# Altium schematic symbol library Minh_Lib.SchLib: 619 symbols (part 3 of 4) (continued)
## HC-05-06-SMD (continued)

## HC-05-06-TH
designator M?
Manufacturer: *; Manufacturer Part Number: *; Local Supplier: thegioiic; Local Supplier Part Numer: *; Local Supplier Link: https://www.thegioiic.com/products/hc-05-thu-phat-bluetooth-ra-chan-master-slave
footprint HC-05-06-TH
pins: 1 STATE, 2 RXD, 3 TXD, 4 GND, 5 VCC, 6 KEY

## HDR1x2_2.54_MALE
designator P?, comment Header1x2_Male
Header1x2_2.54_MALE
footprint HDR1x2_2.54_MALE (Header2x1 2.54 MALE)
pins: 1, 2

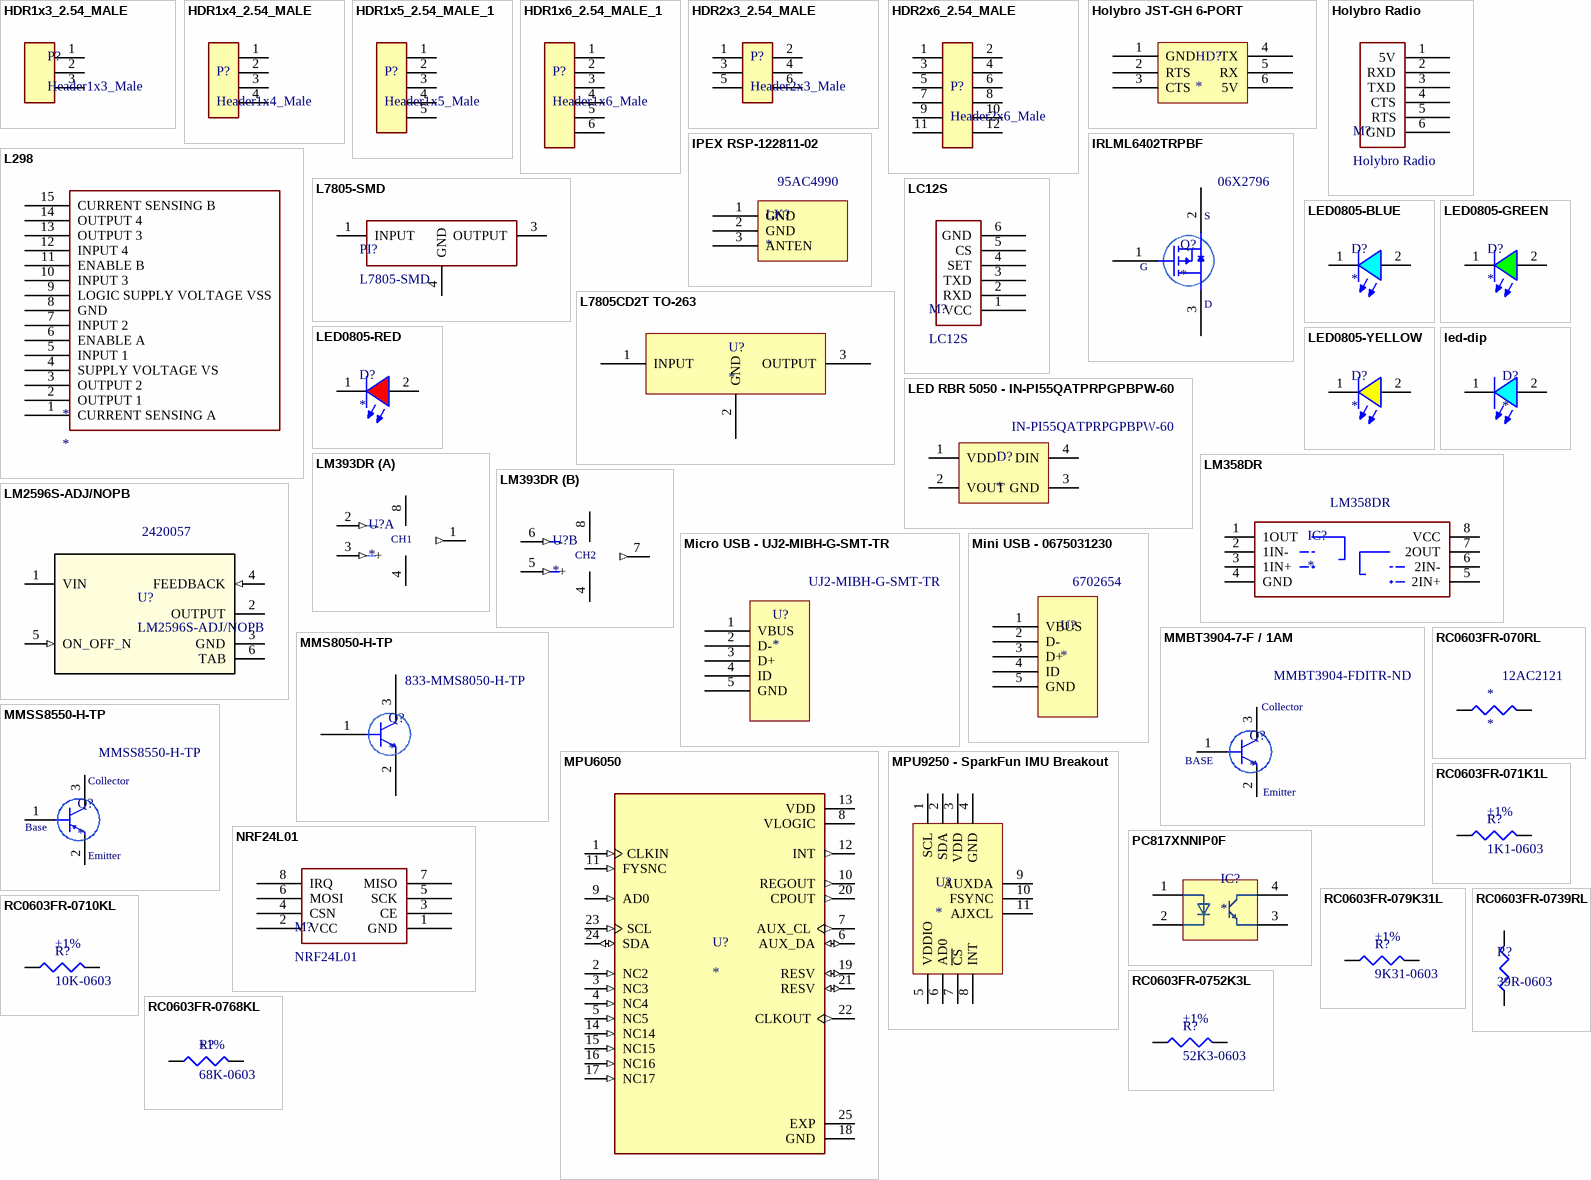
[diagram p10: symbols HDR1x3_2.54_MALE to RC0603FR-0768KL]

## HDR1x3_2.54_MALE
designator P?, comment Header1x3_Male
Header1x3_2.54_MALE
footprint HDR1x3_2.54_MALE (Header 2.54 MALE)
pins: 1, 2, 3

## HDR1x4_2.54_MALE
designator P?, comment Header1x4_Male
Header1x4_2.54_MALE
footprint HDR1X4_2.54_MALE (Header1x4 2.54 Male)
pins: 1, 2, 3, 4

## HDR1x5_2.54_MALE_1
designator P?, comment Header1x5_Male
Header1x5_2.54_MALE
footprint HDR1X5_2.54_MALE (Header1x5 2.54 Male)
pins: 1, 2, 3, 4, 5

## HDR1x6_2.54_MALE_1
designator P?, comment Header1x6_Male
Header1x6_2.54_MALE
footprint HDR1X6_2.54_MALE (Header1x6 2.54 Male)
pins: 1, 2, 3, 4, 5, 6

## HDR2x3_2.54_MALE
designator P?, comment Header2x3_Male
Header2x3_2.54_MALE
footprint HDR2x3_2.54_MALE (Header 2x3 2.54 MALE)
pins: 1, 2, 3, 4, 5, 6

## HDR2x6_2.54_MALE
designator P?, comment Header2x6_Male
Header2x6_2.54_MALE
footprint HDR2X6_2.54_MALE (Header2x6 2.54 Male)
pins: 1, 2, 3, 4, 5, 6, 7, 8, 9, 10, 11, 12

## Holybro JST-GH 6-PORT
designator HD?
footprint BM06B-GHS-TBT (JST - GH - 6 PORT)
pins: 1 GND, 2 RTS, 3 CTS, 4 TX, 5 RX, 6 5V

## Holybro Radio
designator M?
Supplier: *; Supplier Part Number: *; Manufacturer: *; Manufacturer Part Number: *; Supplier Link: https://www.lazada.vn/products/ld-holybro-433mhz-915-mhz-500-mw-thu-phat-vo-tuyen-xa-bo-v3-cho-pixhawk-4-dieu-khien-chuyen-bay-i430804435-s768474304.html?spm=a2o4n.searchlist.list.4.25396b19yIS9XO&search=1; Local Supplier: x; Local Supplier Part Number: x; Local Supplier Link: x
footprint HOLYBRO-RADIO (JP6)
pins: 1 5V, 2 RXD, 3 TXD, 4 CTS, 5 RTS, 6 GND

## IPEX RSP-122811-02
designator LK?  Supplier Part Number 1: 95AC4990
Conn MHF RCP 0Hz to 6GHz 50Ohm Solder ST SMD T/R; Manufacturer: Samtec; Manufacturer Part Number: RSP-122811-02; Frequency: 6Hz; Impedance: 50R; Gender: Female; Operating Frequency: 0 to 6Hz; Supplier 1: Newark; RoHS: Yes; Category: RF / Coaxial Connectors; Stock 1: 1; Pricing 1: 1=3.75000, 10=3.59000, 100=3.00000, 500=2.54000, 1000=2.16000, 2500=1.98000, 5000=1.94000 (USD); Case/Package: SMD/SMT; Packaging: Tape and Reel; Termination: Solder; Connector Type: Solder; Length: 50.8mm; Radiation Hardening: No; RoHS Compliant: Yes; ComponentLink1URL: https://datasheet.ciiva.com/26945/getdatasheetpartid-194902-26945401.pdf?src-supplier=Verical; ComponentLink1Description: https://datasheet.ciiva.com/26945/getdatasheetpartid-194902-26945401.pdf?src-supplier=Verical
footprint IPEX V2
pins: 1 GND, 2 GND, 3 ANTEN

## IRLML6402TRPBF
designator Q?  Supplier Part Number 1: 06X2796
Mosfet, Power; P-ch; Vdss -20V; Rds(on) 0.065 Ohm; Id -3.7A; MICRO3; Pd 1.3W; Vgs +/-12V; Manufacturer: International Rectifier; Manufacturer Part Number: IRLML6402TRPBF; Drain to Source Voltage (Vdss): 20V; Continuous Drain Current (ID): 3.7A; Rise Time: 48ns; Gate to Source Voltage (Vgs): 12V; Turn-On Delay Time: 350ns; Turn-Off Delay Time: 588ns; Fall Time: 381ns; Nominal Vgs: -550mV; Rds On Max: 65mR; Input Capacitance: 633pF; Number of Elements: 1; Element Configuration: Single; Supplier 1: Newark; RoHS: Yes; Category: MOSFETs; Mount: Surface Mount; Case/Package: SOT-23; Number of Pins: 3; Min Operating Temperature: -55°C; Max Operating Temperature: 150°C; Package Quantity: 1; Packaging: Tape and Reel; Max Power Dissipation: 1.3W; Dual Supply Voltage: -20V; Drain to Source Resistance: 65mR; Power Dissipation: 1.3W; Threshold Voltage: -550mV; Termination: SMD/SMT; Drain to Source Breakdown Voltage: -20V; Voltage Rating (DC): -20V; Current Rating: -3.7A; On-State Resistance: 65mR; Series: HEXFET®; Drain-source On Resistance-Max: 65mR; Length: 3.04mm; Width: 1.4mm; Height: 1.02mm; Radiation Hardening: No; Lead Free: Lead Free; RoHS Compliant: Yes; REACH SVHC: No SVHC; ComponentLink1URL: https://datasheet.ciiva.com/7799/13209-7799017.pdf?src-supplier=Element14; ComponentLink1Description: https://datasheet.ciiva.com/7799/13209-7799017.pdf?src-supplier=Element14; ComponentLink2URL: https://datasheet.ciiva.com/34302/1563729-34302500.pdf?src-supplier=Jameco; ComponentLink2Description: https://datasheet.ciiva.com/34302/1563729-34302500.pdf?src-supplier=Jameco; ComponentLink3URL: https://datasheet.ciiva.com/28515/irlml6402pbf-28515795.pdf?src-supplier=Element14; ComponentLink3Description: https://datasheet.ciiva.com/28515/irlml6402pbf-28515795.pdf?src-supplier=Element14; ComponentLink4URL: https://datasheet.ciiva.com/7333/irlml6402-7333200.pdf?src-supplier=Newark; ComponentLink4Description: https://datasheet.ciiva.com/7333/irlml6402-7333200.pdf?src-supplier=Newark; ComponentLink5URL: https://datasheet.ciiva.com/29326/162833-da-01-en-irlml-6402tr-29326798.pdf?src-supplier=Conrad; ComponentLink5Description: https://datasheet.ciiva.com/29326/162833-da-01-en-irlml-6402tr-29326798.pdf?src-supplier=Conrad; ComponentLink6URL: https://datasheet.ciiva.com/7799/13209-7799018.pdf?src-supplier=Element14; ComponentLink6Description: https://datasheet.ciiva.com/7799/13209-7799018.pdf?src-supplier=Element14; ComponentLink7URL: https://datasheet.ciiva.com/936/irlml6402pbf-936987.pdf?src-supplier=Digi-Key; ComponentLink7Description: https://datasheet.ciiva.com/936/irlml6402pbf-936987.pdf?src-supplier=Digi-Key; ComponentLink8URL: https://datasheet.ciiva.com/936/irlml6402pbf-936988.pdf?src-supplier=Digi-Key; ComponentLink8Description: https://datasheet.ciiva.com/936/irlml6402pbf-936988.pdf?src-supplier=Digi-Key; ComponentLink9URL: https://datasheet.ciiva.com/16311/irlml6402pbf-16311535.pdf?src-supplier=Future+Electronics; ComponentLink9Description: https://datasheet.ciiva.com/16311/irlml6402pbf-16311535.pdf?src-supplier=Future+Electronics
footprint SOT23
pins: 1 G, 2 S, 3  
text: D

## L298
designator *
pins: 1 CURRENT SENSING A, 2 OUTPUT 1, 3 OUTPUT 2, 4 SUPPLY VOLTAGE VS, 5 INPUT 1, 6 ENABLE A, 7 INPUT 2, 8 GND, 9 LOGIC SUPPLY VOLTAGE VSS, 10 INPUT 3, 11 ENABLE B, 12 INPUT 4, 13 OUTPUT 3, 14 OUTPUT 4, 15 CURRENT SENSING B

## L7805-SMD
designator PI?
Local Supplier: thegioiic; Local Supplier Part Number: *; Local Supplier Link: https://www.thegioiic.com/products/l7805acd2t
footprint TO254P1435X464-4N
pins: 1 INPUT, 3 OUTPUT, 4 GND

## L7805CD2T TO-263
designator U?
footprint TO263 / D2PAK (D2PAK)
pins: 1 INPUT, 2 GND, 3 OUTPUT

## LC12S
designator M?
Manufacturer: *; Manufacturer Part Number: *; Local Supplier: thegioiic; Local Supplier Link: https://www.thegioiic.com/products/lc12s-mach-thu-phat-rf-2-4ghz-uart-128-kenh-120m; Local Supplier Part Number: *
footprint LC12S
pins: 1 VCC, 2 RXD, 3 TXD, 4 SET, 5 CS, 6 GND

## LED0805-BLUE
designator D?
footprint LED0805-BLUE
pins: 1 +, 2 +

## LED0805-GREEN
designator D?
footprint LED0805-GREEN
pins: 1 +, 2 +

## LED0805-RED
designator D?
footprint LED0805-RED
pins: 1 +, 2 +

## LED0805-YELLOW
designator D?
footprint LED0805-YELLOW
pins: 1 +, 2 +

## LED RBR 5050 - IN-PI55QATPRPGPBPW-60
designator D?  Supplier Part Number 1: IN-PI55QATPRPGPBPW-60
Address Led Discrete Serial Rgbw; Manufacturer: Inolux; Color: White,Blue,Green,Red; Lens Style: Round,Flat; Luminous Intensity: 1850mcd; Forward Voltage: 5.2V; Test Current: 12mA; Dominant Wavelength: 465nm; Supplier 1: Arrow Electronics; Manufacturer Part Number: IN-PI55QATPRPGPBPW-60; RoHS: No; Category: LEDs; Stock 1: 964; Pricing 1: 1=0.71450, 10=0.46990, 25=0.46520, 100=0.30470, 250=0.30220, 500=0.29430 (USD); Mount: Surface Mount; Case/Package: SMD/SMT; Packaging: Tape and Reel; Length: 5mm; Width: 5mm; Height: 1.7mm; ComponentLink1URL: http://www.inolux-corp.com/datasheet/SMDLED/Addressable%20LED/IN-PI55QATPRPGPBPW-XX_v1.2.pdf?src-supplier=Digi-Key; ComponentLink1Description: http://www.inolux-corp.com/datasheet/SMDLED/Addressable%20LED/IN-PI55QATPRPGPBPW-XX_v1.2.pdf?src-supplier=Digi-Key
footprint LED RGB  5050
pins: 1 VDD, 2 VOUT, 3 GND, 4 DIN

## led-dip
designator D?
footprint LED_DIP
pins: 1 +, 2 +

## LM358DR
designator IC?  Supplier Part Number 1: LM358DR
IC OPAMP GP 700KHZ 8SOIC; Manufacturer: Texas Instruments; Slew Rate: 0.3V/µs; Common Mode Rejection Ratio: 65dB; Max Supply Voltage: 32V; Min Supply Voltage: 3V; Min Dual Supply Voltage: 1.5V; Max Dual Supply Voltage: 16V; Number of Channels: 2; Output Current: 30mA; Nominal Supply Current: 1.2mA; Voltage Gain: 100dB; Input Bias Current: 250nA; Input Offset Voltage (Vos): 7mV; Operating Supply Current: 1mA; Amplifier Type: GENERAL PURPOSE; Dual Supply Voltage: 9V; Supplier 1: Arrow Electronics; Manufacturer Part Number: LM358DR; RoHS: Yes; Category: Amplifiers - Op Amps, Buffer, Instrumentation; Stock 1: 1847; Pricing 1: 1=0.39310, 10=0.31690, 25=0.28850, 100=0.21440, 250=0.19280, 500=0.19100, 1000=0.15350 (USD); Mount: Surface Mount; Case/Package: SOIC; Number of Pins: 8; Contact Plating: Gold; Min Operating Temperature: 0°C; Max Operating Temperature: 70°C; Package Quantity: 2500; Packaging: Tape and Reel; Operating Supply Voltage: 16V; Number of Circuits: 2; Gain Bandwidth Product: 700kHz; Output Current per Channel: 30mA; Number of Elements: 2; Series: -; Supply Current: 1.2mA; Technology: BIPOLAR; Number of Amplifiers: 2; Bandwidth: 700kHz; Power Supply Rejection Ratio (PSRR): 65dB; Unity Gain Bandwidth Product: 700kHz; Length: 4.9mm; Width: 3.91mm; Height: 1.58mm; Radiation Hardening: No; Lead Free: Lead Free; RoHS Compliant: Yes; Reach SVHC Compliant: Yes; ComponentLink1URL: https://datasheet.ciiva.com/1795/lm358-1795488.pdf?src-supplier=Digi-Key; ComponentLink1Description: https://datasheet.ciiva.com/1795/lm358-1795488.pdf?src-supplier=Digi-Key; ComponentLink2URL: https://datasheet.ciiva.com/27056/2016330-27056228.pdf?src-supplier=Jameco; ComponentLink2Description: https://datasheet.ciiva.com/27056/2016330-27056228.pdf?src-supplier=Jameco; ComponentLink3URL: https://datasheet.ciiva.com/7709/1874566-7709823.pdf?src-supplier=Element14; ComponentLink3Description: https://datasheet.ciiva.com/7709/1874566-7709823.pdf?src-supplier=Element14; ComponentLink4URL: https://datasheet.ciiva.com/46385/1874566-46385851.pdf?src-supplier=Element14; ComponentLink4Description: https://datasheet.ciiva.com/46385/1874566-46385851.pdf?src-supplier=Element14; ComponentLink5URL: https://datasheet.ciiva.com/46390/1874566-46390414.pdf?src-supplier=Element14; ComponentLink5Description: https://datasheet.ciiva.com/46390/1874566-46390414.pdf?src-supplier=Element14; ComponentLink6URL: https://datasheet.ciiva.com/1795/lm358-1795487.pdf?src-supplier=Digi-Key; ComponentLink6Description: https://datasheet.ciiva.com/1795/lm358-1795487.pdf?src-supplier=Digi-Key; ComponentLink7URL: https://datasheet.ciiva.com/1795/lm358-1795489.pdf?src-supplier=Digi-Key; ComponentLink7Description: https://datasheet.ciiva.com/1795/lm358-1795489.pdf?src-supplier=Digi-Key; ComponentLink8URL: https://datasheet.ciiva.com/2973/lm358a-2973386.pdf?src-supplier=Avnet; ComponentLink8Description: https://datasheet.ciiva.com/2973/lm358a-2973386.pdf?src-supplier=Avnet
footprint SOP8
pins: 1 1OUT, 2 1IN-, 3 1IN+, 4 GND, 5 2IN+, 6 2IN-, 7 2OUT, 8 VCC

## LM393DR
designator U?
Analog Comparator, Dual Differential, 2, 1.3s, 2V to 36V, SOIC, 8
footprint SOP8
part A pins: 1 (out), 2 -  (in), 3 + (in), 4 GND, 8 PWR
part B pins: 4 GND, 5 + (in), 6 -  (in), 7 OUTPUT (out), 8 PWR
part A text: CH1
part B text: CH2

## LM2596S-ADJ/NOPB
designator U?  Supplier Part Number 1: 2420057
Optoisolator 5KV Trans 4SMD / Optocoupler Dc-in 1-CH Transistor Dc-out 4-PIN PDIP SMD; Mfr_Name: Texas Instruments; PartNumber: LM2596SX-ADJ/NOPB; Manufacturer Part Number: PC817XNNIP0F; CompType: IC; Reverse Breakdown Voltage: 6V; Forward Voltage: 1.4V; Forward Current: 50mA; Rise Time: 18000ns; Collector Emitter Voltage (VCEO): 80V; Collector Emitter Saturation Voltage: 200mV; Number of Elements: 1; Power Dissipation: 200mW; Input Type: DC; Output Current per Channel: 30mA; Type: DEV; RefDes: RefDes; Copyright: Copyright (C) 2021 Ultra Librarian. All rights reserved.; Manufacturer_Part_Number: LM2596S-ADJ/NOPB; Alternate_PartNumber: LM2596S-ADJ/NOPB; PackageReference: KTT0005B; MountType: SMT; RoHS: Y; Manufacturer: Texas Instruments; Supplier 1: Farnell; Category: Optocouplers; Pricing 1: 1=0.31700, 25=0.29900, 100=0.21300, 250=0.17700, 500=0.14100, 2000=0.13800 (GBP); Mount: Surface Mount; Case/Package: SMD/SMT; Number of Pins: 4; Contact Plating: Copper,Tin; Min Operating Temperature: -30°C; Max Operating Temperature: 100°C; Fall Time: 18000ns; Packaging: Tape and Reel; Max Power Dissipation: 200mW; Package Quantity: 2000; Number of Channels: 1; Output Voltage: 80V; Max Input Current: 50mA; Max Collector Current: 50mA; Isolation Voltage: 5kV; Input Current: 50mA; Collector-emitter Voltage-Max: 200mV; Max Output Voltage: 80V; Isolation Voltage-Max: 5kV; Radiation Hardening: No; RoHS Compliant: Yes; Lead Free: Lead Free; ComponentLink1URL: https://datasheet.ciiva.com/15119/getdatasheetpartid-299374-15119023.pdf?src-supplier=Verical; ComponentLink1Description: https://datasheet.ciiva.com/15119/getdatasheetpartid-299374-15119023.pdf?src-supplier=Verical; ComponentLink2URL: https://datasheet.ciiva.com/2086/pc817xxnip0f-series-2086508.pdf?src-supplier=Digi-Key; ComponentLink2Description: https://datasheet.ciiva.com/2086/pc817xxnip0f-series-2086508.pdf?src-supplier=Digi-Key; ComponentLink3URL: https://datasheet.ciiva.com/2086/pc817xxnip0f-series-2086507.pdf?src-supplier=Digi-Key; ComponentLink3Description: https://datasheet.ciiva.com/2086/pc817xxnip0f-series-2086507.pdf?src-supplier=Digi-Key; ComponentLink4URL: https://datasheet.ciiva.com/2086/pc817xxnip0f-series-2086509.pdf?src-supplier=Digi-Key; ComponentLink4Description: https://datasheet.ciiva.com/2086/pc817xxnip0f-series-2086509.pdf?src-supplier=Digi-Key; ComponentLink5URL: https://datasheet.ciiva.com/46396/1812378-46396954.pdf?src-supplier=Element14; ComponentLink5Description: https://datasheet.ciiva.com/46396/1812378-46396954.pdf?src-supplier=Element14; ComponentLink6URL: https://datasheet.ciiva.com/46435/1812378-46435723.pdf?src-supplier=Element14; ComponentLink6Description: https://datasheet.ciiva.com/46435/1812378-46435723.pdf?src-supplier=Element14; ComponentLink7URL: https://datasheet.ciiva.com/16475/pc817xnnip0f-16475911.pdf?src-supplier=Future+Electronics; ComponentLink7Description: https://datasheet.ciiva.com/16475/pc817xnnip0f-16475911.pdf?src-supplier=Future+Electronics
footprint TO265-5
pins: 1 VIN (power), 2 OUTPUT (power), 3 GND (power), 4 FEEDBACK (in), 5 ON_OFF_N (in), 6 TAB (power)

## Micro USB - UJ2-MIBH-G-SMT-TR
designator U?  Supplier Part Number 1: UJ2-MIBH-G-SMT-TR
Conn Micro USB 2.0 Type B RCP 5 POS 0.65mm Solder RA SMD 5 Terminal 1 Port T/R; Manufacturer: CUI Devices; Supplier 1: Arrow Electronics; Manufacturer Part Number: UJ2-MIBH-G-SMT-TR; RoHS: Yes; Category: USB Connectors; Stock 1: 6066; Pricing 1: 1=0.44640, 10=0.33470, 25=0.33130, 50=0.32680, 100=0.29350, 250=0.28070, 500=0.26500, 1000=0.21660, 2000=0.19850, 3000=0.19000, 5000=0.18820 (USD)
footprint Micro USB V2 SMD
pins: 1 VBUS, 2 D-, 3 D+, 4 ID, 5 GND

## Mini USB - 0675031230
designator U?  Supplier Part Number 1: 6702654
Conn Mini USB Type B RCP 5 POS 0.8mm Solder RA SMD 5 Terminal 1 Port Embossed T/R; Manufacturer: Molex; Manufacturer Part Number: 0675031230; Number of Terminals/Pins: 5; Gender: Receptacle; Number of Ports: 1; Max Voltage Rating (DC): 30V; Supplier 1: RSComponents; RoHS: Yes; Category: USB Connectors; Stock 1: 1; Pricing 1: 5=1.50900, 125=1.16300, 375=1.06200, 1000=0.83400, 2000=0.78800 (USD); Mount: Surface Mount,Horizontal; Housing Material: Nylon; Contact Material: Copper Alloy; Contact Plating: Gold,Tin; Min Operating Temperature: 0°C; Max Operating Temperature: 50°C; Connector Type: USB; Package Quantity: 1; Packaging: Tape and Reel; Number of Contacts: 5; Termination: Solder; Orientation: Right Angle; Max Voltage Rating (AC): 30V; Features: Shielded; Pitch: 0.8mm; Depth: 9mm; ComponentLink1URL: https://datasheet.ciiva.com/851/675031230-sd-851441.pdf?src-supplier=Digi-Key; ComponentLink1Description: https://datasheet.ciiva.com/851/675031230-sd-851441.pdf?src-supplier=Digi-Key; ComponentLink2URL: https://datasheet.ciiva.com/851/675031230-sd-851442.pdf?src-supplier=Digi-Key; ComponentLink2Description: https://datasheet.ciiva.com/851/675031230-sd-851442.pdf?src-supplier=Digi-Key; ComponentLink3URL: https://datasheet.ciiva.com/851/675031230-sd-851443.pdf?src-supplier=Digi-Key; ComponentLink3Description: https://datasheet.ciiva.com/851/675031230-sd-851443.pdf?src-supplier=Digi-Key
footprint Mini USB TYPE B
pins: 1 VBUS, 2 D-, 3 D+, 4 ID, 5 GND

## MMBT3904-7-F / 1AM
designator Q?  Supplier Part Number 1: MMBT3904-FDITR-ND
Transistor General Purpose BJT NPN 40 Volt 0.2A Automotive 3-Pin SOT-23; Manufacturer: Diodes Zetex; Manufacturer Part Number: MMBT3904-7-F; Collector Emitter Breakdown Voltage: 40V; Max Power Dissipation: 300mW; Max Collector Current: 200mA; Transition Frequency: 300MHz; Collector Base Voltage (VCBO): 60V; Emitter Base Voltage (VEBO): 6V; Collector Emitter Saturation Voltage: 300mV; Element Configuration: Single; hFE Min: 100; Power Dissipation: 350mW; Number of Elements: 1; Supplier 1: Digi-Key; RoHS: Yes; Category: BJTs; Stock 1: 468030; Pricing 1: 3000=0.02271, 6000=0.02048, 15000=0.01781, 30000=0.01603, 75000=0.01425 (USD); Mount: Surface Mount; Case/Package: SOT-23; Number of Pins: 3; Contact Plating: Tin,Matte; Weight: 0.000282oz; Min Operating Temperature: -55°C; Max Operating Temperature: 150°C; Packaging: Tape and Reel; Polarity: NPN; Package Quantity: 3000; Collector Emitter Voltage (VCEO): 40V; Gain Bandwidth Product: 300MHz; Frequency: 300MHz; Max Breakdown Voltage: 40V; Series: -; Collector-emitter Voltage-Max: 300mV; Voltage Rating (DC): 40V; Max Frequency: 300MHz; Continuous Collector Current: 200mA; Length: 3.05mm; Width: 1.4mm; Height: 1mm; Radiation Hardening: No; RoHS Compliant: Yes; Lead Free: Lead Free; REACH SVHC: No SVHC; ComponentLink1URL: https://datasheet.ciiva.com/11201/ds30036-11201778.pdf?src-supplier=Avnet; ComponentLink1Description: https://datasheet.ciiva.com/11201/ds30036-11201778.pdf?src-supplier=Avnet; ComponentLink2URL: https://datasheet.ciiva.com/15138/getdatasheetpartid-53265-15138780.pdf?src-supplier=Verical; ComponentLink2Description: https://datasheet.ciiva.com/15138/getdatasheetpartid-53265-15138780.pdf?src-supplier=Verical; ComponentLink3URL: https://datasheet.ciiva.com/22711/1915516-22711750.pdf?src-supplier=Element14; ComponentLink3Description: https://datasheet.ciiva.com/22711/1915516-22711750.pdf?src-supplier=Element14; ComponentLink4URL: https://datasheet.ciiva.com/11198/ds30036-11198999.pdf?src-supplier=Avnet; ComponentLink4Description: https://datasheet.ciiva.com/11198/ds30036-11198999.pdf?src-supplier=Avnet; ComponentLink5URL: https://datasheet.ciiva.com/6361/ds30036-6361256.pdf?src-supplier=Digi-Key; ComponentLink5Description: https://datasheet.ciiva.com/6361/ds30036-6361256.pdf?src-supplier=Digi-Key; ComponentLink6URL: https://datasheet.ciiva.com/6361/ds30036-6361254.pdf?src-supplier=Digi-Key; ComponentLink6Description: https://datasheet.ciiva.com/6361/ds30036-6361254.pdf?src-supplier=Digi-Key
footprint SOT23
pins: 1, 2, 3
text: Collector; BASE; Emitter

## MMS8050-H-TP
designator Q?  Supplier Part Number 1: 833-MMS8050-H-TP
Trans Gp Bjt NPN 25V 0.5A 3-PIN SOT-23 T/r; Manufacturer: MCC; Manufacturer Part Number: MMS8050-H-TP; Max Collector Current: 500mA; Collector Emitter Voltage (VCEO): 600mV; Max Power Dissipation: 300mW; Transition Frequency: 150MHz; Supplier 1: Mouser; RoHS: Yes; Category: Uncategorized; Stock 1: 417; Pricing 1: 1=0.21000, 10=0.17100, 50=0.17100, 100=0.09100, 1000=0.04100, 10000=0.02700 (USD); Mount: Surface Mount; Case/Package: TO-236-3; Number of Pins: 3; Min Operating Temperature: -55°C; Max Operating Temperature: 150°C; Packaging: Tape and Reel; Collector Emitter Breakdown Voltage: 25V; RoHS Compliant: Yes; ComponentLink1URL: http://components.arrow.com/part/dataview/56206496S302966N2022?src-supplier=Arrow+Electronics; ComponentLink1Description: http://components.arrow.com/part/dataview/56206496S302966N2022?src-supplier=Arrow+Electronics; ComponentLink2URL: http://www.mccsemi.com/up_pdf/MMS8050(SOT-23).pdf?src-supplier=Digi-Key; ComponentLink2Description: http://www.mccsemi.com/up_pdf/MMS8050(SOT-23).pdf?src-supplier=Digi-Key
footprint SOT23
pins: 1, 2, 3

## MMSS8550-H-TP
designator Q?  Supplier Part Number 1: MMSS8550-H-TP
PNP Ic=1.5A Vceo=25V hfe=120~350 fT=100MHz; Manufacturer: MCC; Collector Emitter Voltage (VCEO): 500mV; hFE Min: 40; Max Power Dissipation: 625mW; Max Collector Current: 1.5A; Transition Frequency: 100MHz; Collector Emitter Breakdown Voltage: 25V; Collector Base Voltage (VCBO): 40V; Emitter Base Voltage (VEBO): 1.6V; Element Configuration: Single; Supplier 1: Arrow Electronics; Manufacturer Part Number: MMSS8550-H-TP; RoHS: Yes; Category: BJTs; Stock 1: 3000; Pricing 1: 3000=0.03920, 6000=0.03880, 15000=0.02460, 30000=0.02430 (USD); Mount: Surface Mount; Case/Package: SOT-23; Min Operating Temperature: -55°C; Max Operating Temperature: 150°C; Package Quantity: 1; Packaging: Tape and Reel; Polarity: PNP; Collector Emitter Saturation Voltage: 500mV; Gain Bandwidth Product: 100MHz; Series: -; Collector-emitter Voltage-Max: 500mV; Max Breakdown Voltage: 25V; Lead Free: Lead Free; RoHS Compliant: Yes; ComponentLink1URL: https://datasheet.ciiva.com/16285/mmss8550sot-23-12703-16285519.pdf?src-supplier=Mouser; ComponentLink1Description: https://datasheet.ciiva.com/16285/mmss8550sot-23-12703-16285519.pdf?src-supplier=Mouser; ComponentLink2URL: https://datasheet.ciiva.com/17380/mmss8550sot-23-17380226.pdf?src-supplier=Future+Electronics; ComponentLink2Description: https://datasheet.ciiva.com/17380/mmss8550sot-23-17380226.pdf?src-supplier=Future+Electronics; ComponentLink3URL: https://datasheet.ciiva.com/6356/mmss8550sot-23-6356926.pdf?src-supplier=Digi-Key; ComponentLink3Description: https://datasheet.ciiva.com/6356/mmss8550sot-23-6356926.pdf?src-supplier=Digi-Key; ComponentLink4URL: https://datasheet.ciiva.com/6356/mmss8550sot-23-6356927.pdf?src-supplier=Digi-Key; ComponentLink4Description: https://datasheet.ciiva.com/6356/mmss8550sot-23-6356927.pdf?src-supplier=Digi-Key; ComponentLink5URL: https://datasheet.ciiva.com/6356/mmss8550sot-23-6356925.pdf?src-supplier=Digi-Key; ComponentLink5Description: https://datasheet.ciiva.com/6356/mmss8550sot-23-6356925.pdf?src-supplier=Digi-Key
footprint SOT23
pins: 1, 2, 3
text: Collector; Base; Emitter

## MPU6050
designator U?
Accelerometer, Gyroscope, 6 Axis Sensor IÂ²C Output; MP: MPU6050; MF: TDK InvenSense; Price: None; Package: VFQFN-24 TDK InvenSense; Value: *; Availability: Unavailable; SnapEDA_Link: https://www.snapeda.com/parts/MPU6050/TDK%20InvenSense/view-part/3605706/?ref=snap
footprint IC_MPU6050
pins: 1 CLKIN (in), 2 NC2 (in), 3 NC3 (in), 4 NC4 (in), 5 NC5 (in), 6 AUX_DA (io), 7 AUX_CL (out), 8 VLOGIC (power), 9 AD0 (in), 10 REGOUT (out), 11 FYSNC (in), 12 INT (out), 13 VDD (power), 14 NC14 (in), 15 NC15 (in), 16 NC16 (in), 17 NC17 (in), 18 GND (power), 19 RESV (io), 20 CPOUT (out), 21 RESV (io), 22 CLKOUT (out), 23 SCL (in), 24 SDA (io), 25 EXP (power)

## MPU9250 - SparkFun IMU Breakout
designator U?
footprint MPU9250 - SparkFun
pins: 1 SCL, 2 SDA, 3 VDD, 4 GND, 5 VDDIO, 6 AD0, 7 ~{CS}, 8 INT, 9 AUXDA, 10 FSYNC, 11 AJXCL

## NRF24L01
designator M?
Local Supplier: thegioiic; Local Supplier Part Number: *; Manufacturer: *; Manufactuere Part Number: *; Local Supplier Link: https://www.thegioiic.com/products/nrf24l01-pa-lna-thu-phat-rf-2-4ghz-1000m
footprint NRF24L01
pins: 1 GND, 2 VCC, 3 CE, 4 CSN, 5 SCK, 6 MOSI, 7 MISO, 8 IRQ

## PC817XNNIP0F
designator IC?
Optoisolator 5KV Trans 4SMD / Optocoupler Dc-in 1-CH Transistor Dc-out 4-PIN PDIP SMD
footprint SOP4
pins: 1 Anode, 2 Cathode, 3 Emitter, 4 Collector

## RC0603FR-070RL
designator *  Supplier Part Number 1: 12AC2121
RC Series 0603 0.1 W 0 Ohm Jumper Surface Mount Thick Film Chip Resistor; Manufacturer: Yageo; Manufacturer Part Number: RC0603FR-070RL; Resistance: 0mR; Power Rating: 100mW; Tolerance: 1%; Voltage Rating (DC): 50V; Temperature Coefficient: 200ppm/°C; Current Rating: 1A; Working Voltage: 75V; Supplier 1: Newark; RoHS: Yes; Category: Chip SMD Resistors; Stock 1: 3690000; Pricing 1: 1=0.00300, 5000=0.00300 (USD); Case/Package: 0603; Number of Pins: 2; Contact Plating: Tin,Matte; Case Code (Metric): 1608; Case Code (Imperial): 0603; Min Operating Temperature: -55°C; Max Operating Temperature: 155°C; Packaging: Tape and Reel; Resistor Type: Thick Film; Package Quantity: 5000; Voltage Rating: 50V; Number of Terminations: 2; Termination: SMD/SMT; Max Power Dissipation: 100mW; Features: Moisture Resistant; Series: RC; Construction: Rectangular; Resistance Tolerance: 1%; Technology: THICK FILM; Length: 1.6mm; Width: 0.8mm; Height: 0.45mm; Depth: 0.8mm; Radiation Hardening: No; Reach SVHC Compliant: Yes; Lead Free: Lead Free; RoHS Compliant: Yes; Military Standard: Not; ComponentLink1URL: https://datasheet.ciiva.com/11808/0900766b80f96399-11808172.pdf?src-supplier=RSComponents; ComponentLink1Description: https://datasheet.ciiva.com/11808/0900766b80f96399-11808172.pdf?src-supplier=RSComponents; ComponentLink2URL: https://datasheet.ciiva.com/5684/443971-5684699.pdf?src-supplier=Farnell; ComponentLink2Description: https://datasheet.ciiva.com/5684/443971-5684699.pdf?src-supplier=Farnell; ComponentLink3URL: https://datasheet.ciiva.com/7983/443971-7983627.pdf?src-supplier=Element14; ComponentLink3Description: https://datasheet.ciiva.com/7983/443971-7983627.pdf?src-supplier=Element14; ComponentLink4URL: https://datasheet.ciiva.com/22643/1868787-22643388.pdf?src-supplier=Element14; ComponentLink4Description: https://datasheet.ciiva.com/22643/1868787-22643388.pdf?src-supplier=Element14; ComponentLink5URL: https://datasheet.ciiva.com/46382/443971-46382072.pdf?src-supplier=Element14; ComponentLink5Description: https://datasheet.ciiva.com/46382/443971-46382072.pdf?src-supplier=Element14; ComponentLink6URL: https://datasheet.ciiva.com/29721/pyu-r-int-thick-7-29721178.pdf?src-supplier=Digi-Key; ComponentLink6Description: https://datasheet.ciiva.com/29721/pyu-r-int-thick-7-29721178.pdf?src-supplier=Digi-Key; ComponentLink7URL: https://datasheet.ciiva.com/29721/pyu-rc0603-51-rohs-l-4-29721179.pdf?src-supplier=Digi-Key; ComponentLink7Description: https://datasheet.ciiva.com/29721/pyu-rc0603-51-rohs-l-4-29721179.pdf?src-supplier=Digi-Key; ComponentLink8URL: https://datasheet.ciiva.com/5558/rc0603-272842-5558341.pdf?src-supplier=Mouser; ComponentLink8Description: https://datasheet.ciiva.com/5558/rc0603-272842-5558341.pdf?src-supplier=Mouser
footprint RES0603 - 3D
pins: 1, 2

## RC0603FR-071K1L
designator R?, comment 1K1-0603  Tolerance: ±1%
RES SMD 1.1K OHM 1% 1/10W 0603; Manufacturer: Yageo; Manufacturer Part Number: RC0603FR-071K1L; Power (Watts): 0.1W, 1/10W; Temperature Coefficient: ±100ppm/°C; Value: 1K1; Supplier 1: Digi-Key; RoHS: RoHS Compliant; Category: Resistors; Stock 1: 427612; Pricing 1: 1=0.1, 10=0.015, 100=0.006, 1000=0.00268, 2500=0.00233 (USD); Packaging: Cut Tape (CT); Part Status: Active; Composition: Thick Film; Features: Moisture Resistant; Operating Temperature: -55°C ~ 155°C; Package / Case: 0603 (1608 Metric); Supplier Device Package: 0603; Size / Dimension: 0.063" L x 0.032" W (1.60mm x 0.80mm); Height - Seated (Max): 0.022" (0.55mm); Failure Rate: -; ComponentLink1URL: http://www.yageo.com/documents/recent/PYu-RC_Group_51_RoHS_L_7.pdf; ComponentLink1Description: http://www.yageo.com/documents/recent/PYu-RC_Group_51_RoHS_L_7.pdf; Supplier Part Number 1: 311-1.10KHRCT-ND
footprint RES0603 - 3D
pins: 1, 2

## RC0603FR-079K31L
designator R?, comment 9K31-0603  Tolerance: ±1%
RES SMD 9.31K OHM 1% 1/10W 0603; Manufacturer: Yageo; Manufacturer Part Number: RC0603FR-079K31L; Power (Watts): 0.1W, 1/10W; Temperature Coefficient: ±100ppm/°C; Value: 9K31; Supplier 1: Digi-Key; RoHS: RoHS Compliant; Category: Resistors; Stock 1: 107883; Pricing 1: 1=0.1, 10=0.015, 100=0.006, 1000=0.00268, 2500=0.00233 (USD); Packaging: Cut Tape (CT); Part Status: Active; Composition: Thick Film; Features: Moisture Resistant; Operating Temperature: -55°C ~ 155°C; Package / Case: 0603 (1608 Metric); Supplier Device Package: 0603; Size / Dimension: 0.063" L x 0.032" W (1.60mm x 0.80mm); Height - Seated (Max): 0.022" (0.55mm); Failure Rate: -; ComponentLink1URL: http://www.yageo.com/documents/recent/PYu-RC_Group_51_RoHS_L_7.pdf; ComponentLink1Description: http://www.yageo.com/documents/recent/PYu-RC_Group_51_RoHS_L_7.pdf; Supplier Part Number 1: 311-9.31KHRCT-ND
footprint RES0603 - 3D
pins: 1, 2

## RC0603FR-0710KL
designator R?, comment 10K-0603  Tolerance: ±1%
RES SMD 10K OHM 1% 1/10W 0603; Manufacturer: Yageo; Manufacturer Part Number: RC0603FR-0710KL; Power (Watts): 0.1W, 1/10W; Temperature Coefficient: ±100ppm/°C; Supplier 1: Digi-Key; RoHS: RoHS Compliant; Category: Resistors; Stock 1: 16545228; Pricing 1: 1=0.1, 10=0.015, 100=0.006, 1000=0.00268, 2500=0.00233 (USD); Packaging: Cut Tape (CT); Part Status: Active; Composition: Thick Film; Features: Moisture Resistant; Operating Temperature: -55°C ~ 155°C; Package / Case: 0603 (1608 Metric); Supplier Device Package: 0603; Size / Dimension: 0.063" L x 0.032" W (1.60mm x 0.80mm); Height - Seated (Max): 0.022" (0.55mm); Failure Rate: -; ComponentLink1URL: http://www.yageo.com/documents/recent/PYu-RC_Group_51_RoHS_L_7.pdf; ComponentLink1Description: http://www.yageo.com/documents/recent/PYu-RC_Group_51_RoHS_L_7.pdf; Supplier Part Number 1: 311-10.0KHRCT-ND; Value: 10K
footprint RES0603 - 3D
pins: 1, 2

## RC0603FR-0739RL
designator R?, comment 39R-0603
RES SMD 39 OHM 1% 1/10W 0603; Manufacturer: Yageo; Manufacturer Part Number: RC0603FR-0739RL; Power (Watts): 0.1W, 1/10W; Temperature Coefficient: ±100ppm/°C; Value: 39R; Supplier 1: Digi-Key; RoHS: RoHS Compliant; Category: Resistors; Stock 1: 405934; Pricing 1: 1=0.1, 10=0.026, 100=0.0107, 1000=0.00478, 2500=0.00415 (USD); Packaging: Cut Tape (CT); Part Status: Active; Tolerance: ±1%; Composition: Thick Film; Features: Moisture Resistant; Operating Temperature: -55°C ~ 155°C; Package / Case: 0603 (1608 Metric); Supplier Device Package: 0603; Size / Dimension: 0.063" L x 0.032" W (1.60mm x 0.80mm); Height - Seated (Max): 0.022" (0.55mm); Failure Rate: -; ComponentLink1URL: http://www.yageo.com/documents/recent/PYu-RC_Group_51_RoHS_L_9.pdf; ComponentLink1Description: http://www.yageo.com/documents/recent/PYu-RC_Group_51_RoHS_L_9.pdf; Supplier Part Number 1: 311-39.0HRCT-ND
footprint RES0603 - 3D
pins: 1, 2

## RC0603FR-0752K3L
designator R?, comment 52K3-0603  Tolerance: ±1%
RES SMD 52.3K OHM 1% 1/10W 0603; Manufacturer: Yageo; Manufacturer Part Number: RC0603FR-0752K3L; Power (Watts): 0.1W, 1/10W; Temperature Coefficient: ±100ppm/°C; Value: 52K3; Supplier 1: Digi-Key; RoHS: RoHS Compliant; Category: Resistors; Stock 1: 187106; Pricing 1: 1=0.1, 10=0.015, 100=0.006, 1000=0.00268, 2500=0.00233 (USD); Packaging: Cut Tape (CT); Part Status: Active; Composition: Thick Film; Features: Moisture Resistant; Operating Temperature: -55°C ~ 155°C; Package / Case: 0603 (1608 Metric); Supplier Device Package: 0603; Size / Dimension: 0.063" L x 0.032" W (1.60mm x 0.80mm); Height - Seated (Max): 0.022" (0.55mm); Failure Rate: -; ComponentLink1URL: http://www.yageo.com/documents/recent/PYu-RC_Group_51_RoHS_L_7.pdf; ComponentLink1Description: http://www.yageo.com/documents/recent/PYu-RC_Group_51_RoHS_L_7.pdf; Supplier Part Number 1: 311-52.3KHRCT-ND
footprint RES0603 - 3D
pins: 1, 2

## RC0603FR-0768KL
designator R?, comment 68K-0603  Tolerance: ±1%